# Altium footprint library connectors.PcbLib: 256 footprints (part 16 of 16)
Each footprint in its own frame and in the unit in brackets; x right, y up, seen from the top. Pads: shape width x height; smd on the part's side, far side on the other; paste and mask are expansions set on the pad; w line width, h text height; cw(c..) or ccw(c..) is an arc to the next point about the centre after c.
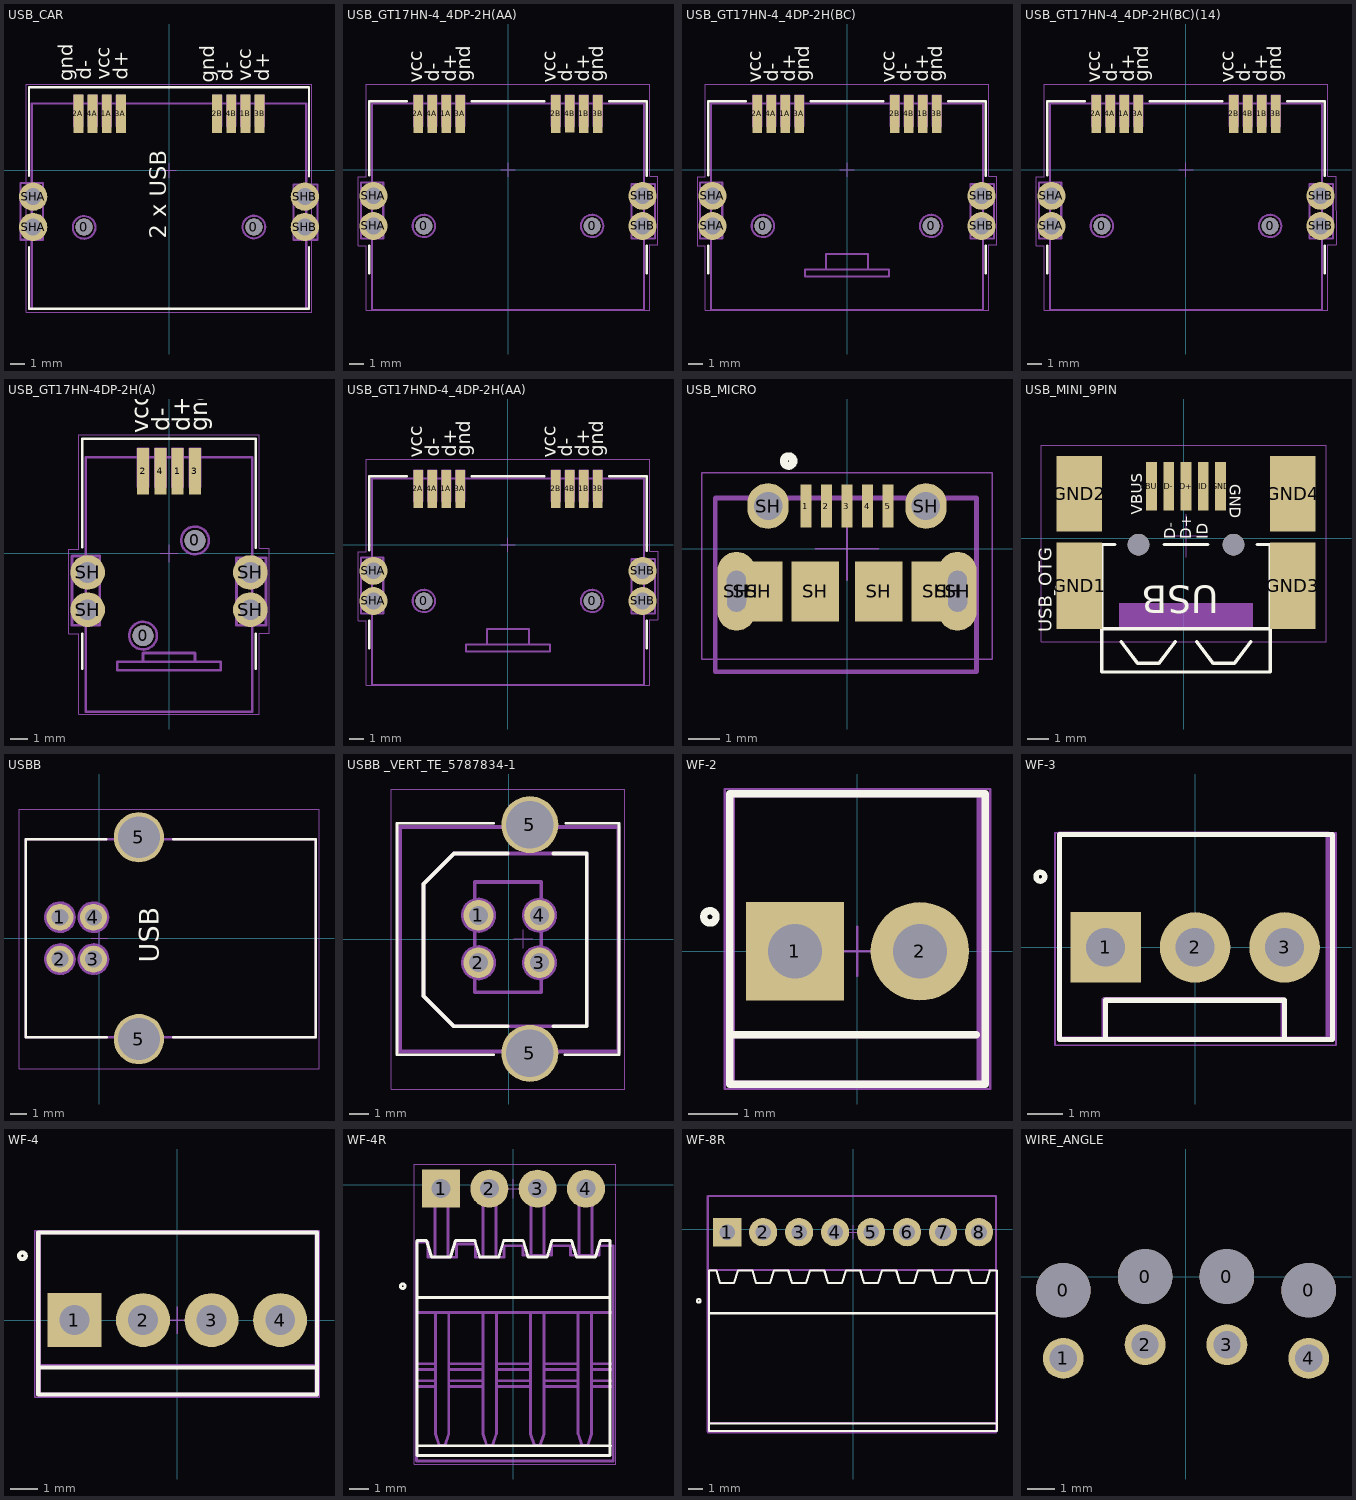
[diagram p15: the footprints below, top view; thin cyan lines are the x and y axes]

## USB_CAR [mm]
height 10.95
pads (14):
  round 1.2 hole 1.2 unplated: 0(-6,-4) 0(6,-4)
  rect 0.7x2.7 smd: 1A(-4.4,4) 1B(5.4,4) 2A(-6.4,4) 2B(3.4,4) 3A(-3.4,4) 3B(6.4,4) 4A(-5.4,4) 4B(4.4,4)
  round 2 hole 1.2: SHA(-9.6,-4) SHA(-9.6,-1.85) SHB(9.6,-1.85) SHB(9.6,-4)
Top Overlay:
  lines w0.15: -9.9,-5.4 -9.9,-9.775 9.9,-9.775 9.9,-5.4 ; -9.9,-0.4 -9.9,5.875 9.9,5.875 9.9,-0.425
  text "2 x USB" at 0.2,-4.825 h2
  text "d+" at -2.9,6.4 h1
  text "vcc" at -4.2,6.4 h1
  text "d-" at -5.5,6.4 h1
  text "gnd" at -6.8,6.3 h1
  text "d-" at 4.5,6.3 h1
  text "vcc" at 5.8,6.3 h1
  text "d+" at 7.1,6.3 h1
  text "gnd" at 3.2,6.2 h1
TopAssy 13:
  circle w0.15: c6,-4 r0.8
  circle w0.15: c-6,-4.025 r0.8
  lines w0.15: -10.5,-4.9 -10.5,-0.9 -8.9,-0.9 -8.9,-4.9 -10.5,-4.9 ; -9.7,-9.8 -9.7,4.725 9.7,4.725 9.7,-9.8 -9.7,-9.8 ; -6.7,3.1 -6.1,3.1 -6.1,5.3 -6.7,5.3 -6.7,3.1 ; -5.7,3.1 -5.1,3.1 -5.1,5.3 -5.7,5.3 -5.7,3.1 ; -4.7,3.1 -4.1,3.1 -4.1,5.3 -4.7,5.3 -4.7,3.1 ; -3.7,3.1 -3.1,3.1 -3.1,5.3 -3.7,5.3 -3.7,3.1 ; 3.1,3.1 3.7,3.1 3.7,5.3 3.1,5.3 3.1,3.1 ; 4.1,3.1 4.7,3.1 4.7,5.3 4.1,5.3 4.1,3.1 ; 5.1,3.1 5.7,3.1 5.7,5.3 5.1,5.3 5.1,3.1 ; 6.1,3.1 6.1,5.3 6.7,5.3 6.7,3.1 6.1,3.1 ; 8.8,-4.9 10.5,-4.9 10.5,-1 8.8,-1 8.8,-4.9
  text "PCB Edge" at -6.3,-9.6 h0.96
TopCourt 15:
  lines w0.05: -0.5,0 0.5,0 ; 0,-0.5 0,0.5 ; -10.1,-10.025 10.1,-10.025 10.1,6.1 -10.1,6.1 -10.1,-10.025
3D body "c-2288060-1-a.step": height 13.57, standoff -2.88, extent -9.8,-9.942 9.8,4.825

## USB_GT17HN-4_4DP-2H(AA) [mm] "USB Connector Hirose GT17HN-4_4DP-2H(AA)"
height 10.95
pads (14):
  round 1.2 hole 1.2 unplated: 0(-6,-4) 0(6,-4)
  rect 0.7x2.7 smd: 1A(-4.4,4) 1B(5.4,4) 2A(-6.4,4) 2B(3.4,4) 3A(-3.4,4) 3B(6.4,4) 4A(-5.4,4) 4B(4.4,4)
  round 2 hole 1.2: SHA(-9.6,-4) SHA(-9.6,-1.85) SHB(9.6,-1.85) SHB(9.6,-4)
Top Overlay:
  lines w0.15: -9.9,-7.4 -9.9,-5.4 ; -9.9,-0.4 -9.9,4.9 -7.2,4.9 ; -2.6,4.9 2.6,4.9 ; 7.2,4.9 9.9,4.9 9.9,-0.425 ; 9.9,-7.4 9.9,-5.4
  text "d-" at -4.9,6.3 h1
  text "vcc" at -6.1,6.2 h1
  text "d+" at -3.7,6.3 h1
  text "gnd" at -2.7,6.3 h1
  text "gnd" at 6.8,6.3 h1
  text "d+" at 5.8,6.3 h1
  text "vcc" at 3.4,6.2 h1
  text "d-" at 4.6,6.3 h1
TopAssy 13:
  circle w0.15: c-6,-4 r0.8
  circle w0.15: c6,-4 r0.8
  lines w0.15: -10.5,-4.9 -8.9,-4.9 -8.9,-0.9 -10.5,-0.9 -10.5,-4.9 ; -9.7,-10 9.7,-10 9.7,4.725 -9.7,4.725 -9.7,-10 ; -6.7,3.1 -6.7,5.3 -6.1,5.3 -6.1,3.1 -6.7,3.1 ; -5.7,3.1 -5.7,5.3 -5.1,5.3 -5.1,3.1 -5.7,3.1 ; -4.7,3.1 -4.7,5.3 -4.1,5.3 -4.1,3.1 -4.7,3.1 ; -3.7,3.1 -3.7,5.3 -3.1,5.3 -3.1,3.1 -3.7,3.1 ; 3.1,3.1 3.1,5.3 3.7,5.3 3.7,3.1 3.1,3.1 ; 4.1,3.1 4.1,5.3 4.7,5.3 4.7,3.1 4.1,3.1 ; 5.1,3.1 5.1,5.3 5.7,5.3 5.7,3.1 5.1,3.1 ; 6.1,3.1 6.7,3.1 6.7,5.3 6.1,5.3 6.1,3.1 ; 8.8,-4.9 8.8,-1 10.5,-1 10.5,-4.9 8.8,-4.9
TopCourt 15:
  lines w0.05: -0.5,0 0.5,0 ; 0,-0.5 0,0.5 ; -10.7,-5.4 -10.1,-5.4 -10.1,-5.994 -10.1,-10.025 10.1,-10.025 10.1,-5.35 10.7,-5.35 10.7,-0.45 10.1,-0.45 10.1,6.1 -10.1,6.1 -10.1,2.069 -10.1,-0.5 -10.7,-0.5 -10.7,-5.4
3D body "GT17HN-44DP-2H(AA).stp": height 13.6, standoff -1, extent -9.8,-9.95 9.8,4.8

## USB_GT17HN-4_4DP-2H(BC) [mm] "USB Connector Hirose GT17HN-4_4DP-2H(BC)"
height 10.95
pads (14):
  round 1.2 hole 1.2 unplated: 0(-6,-4) 0(6,-4)
  rect 0.7x2.7 smd: 1A(-4.4,4) 1B(5.4,4) 2A(-6.4,4) 2B(3.4,4) 3A(-3.4,4) 3B(6.4,4) 4A(-5.4,4) 4B(4.4,4)
  round 2 hole 1.2: SHA(-9.6,-4) SHA(-9.6,-1.85) SHB(9.6,-1.85) SHB(9.6,-4)
Top Overlay:
  lines w0.15: -9.9,-7.4 -9.9,-5.4 ; -9.9,-0.4 -9.9,4.9 -7.2,4.9 ; -2.6,4.9 2.6,4.9 ; 7.2,4.9 9.9,4.9 9.9,-0.425 ; 9.9,-7.4 9.9,-5.4
  text "d-" at 4.6,6.3 h1
  text "vcc" at 3.4,6.2 h1
  text "d+" at 5.8,6.3 h1
  text "gnd" at 6.8,6.3 h1
  text "gnd" at -2.7,6.3 h1
  text "d+" at -3.7,6.3 h1
  text "vcc" at -6.1,6.2 h1
  text "d-" at -4.9,6.3 h1
TopAssy 13:
  circle w0.15: c6,-4 r0.8
  circle w0.15: c-6,-4 r0.8
  lines w0.15: -1.5,-7.1 -1.5,-6 1.5,-6 1.5,-7.1 ; -10.5,-4.9 -10.5,-0.9 -8.9,-0.9 -8.9,-4.9 -10.5,-4.9 ; -9.7,-10 -9.7,4.725 9.7,4.725 9.7,-10 -9.7,-10 ; -6.7,3.1 -6.1,3.1 -6.1,5.3 -6.7,5.3 -6.7,3.1 ; -5.7,3.1 -5.1,3.1 -5.1,5.3 -5.7,5.3 -5.7,3.1 ; -4.7,3.1 -4.1,3.1 -4.1,5.3 -4.7,5.3 -4.7,3.1 ; -3.7,3.1 -3.1,3.1 -3.1,5.3 -3.7,5.3 -3.7,3.1 ; -3,-7.6 3,-7.6 3,-7.1 -3,-7.1 -3,-7.6 ; 3.1,3.1 3.7,3.1 3.7,5.3 3.1,5.3 3.1,3.1 ; 4.1,3.1 4.7,3.1 4.7,5.3 4.1,5.3 4.1,3.1 ; 5.1,3.1 5.7,3.1 5.7,5.3 5.1,5.3 5.1,3.1 ; 6.1,3.1 6.1,5.3 6.7,5.3 6.7,3.1 6.1,3.1 ; 8.8,-4.9 10.5,-4.9 10.5,-1 8.8,-1 8.8,-4.9
  text "PCB Edge" at -1.3,-8 h0.96
TopCourt 15:
  lines w0.05: -0.5,0 0.5,0 ; 0,-0.5 0,0.5 ; -10.7,-5.4 -10.7,-0.5 -10.1,-0.5 -10.1,2.069 -10.1,6.1 10.1,6.1 10.1,-0.45 10.7,-0.45 10.7,-5.35 10.1,-5.35 10.1,-10.025 -10.1,-10.025 -10.1,-5.994 -10.1,-5.4 -10.7,-5.4
3D body "GT17HN-4_4DP-2H(BC).stp": height 19.6, standoff -3, extent -9.8,-9.95 9.8,4.8

## USB_GT17HN-4_4DP-2H(BC)(14) [mm] "USB Connector Hirose USB_GT17HN-4/4DP-2H(BC)(14)"
height 10.95
pads (14):
  round 1.2 hole 1.2 unplated: 0(-6,-4) 0(6,-4)
  rect 0.7x2.7 smd: 1A(-4.4,4) 1B(5.4,4) 2A(-6.4,4) 2B(3.4,4) 3A(-3.4,4) 3B(6.4,4) 4A(-5.4,4) 4B(4.4,4)
  round 2 hole 1.2: SHA(-9.6,-1.85) SHA(-9.6,-4) SHB(9.6,-4) SHB(9.6,-1.85)
Top Overlay:
  lines w0.15: -9.9,-7.4 -9.9,-5.4 ; -9.9,-0.4 -9.9,4.9 -7.2,4.9 ; -2.6,4.9 2.6,4.9 ; 7.2,4.9 9.9,4.9 9.9,-0.425 ; 9.9,-7.4 9.9,-5.4
  text "d-" at 4.6,6.3 h1
  text "vcc" at 3.4,6.2 h1
  text "d+" at 5.8,6.3 h1
  text "gnd" at 6.8,6.3 h1
  text "gnd" at -2.7,6.3 h1
  text "d+" at -3.7,6.3 h1
  text "vcc" at -6.1,6.2 h1
  text "d-" at -4.9,6.3 h1
TopAssy 13:
  circle w0.15: c6,-4 r0.8
  circle w0.15: c-6,-4 r0.8
  lines w0.15: -10.5,-4.9 -10.5,-0.9 -8.9,-0.9 -8.9,-4.9 -10.5,-4.9 ; -9.7,-10 -9.7,4.725 9.7,4.725 9.7,-10 -9.7,-10 ; -6.7,3.1 -6.1,3.1 -6.1,5.3 -6.7,5.3 -6.7,3.1 ; -5.7,3.1 -5.1,3.1 -5.1,5.3 -5.7,5.3 -5.7,3.1 ; -4.7,3.1 -4.1,3.1 -4.1,5.3 -4.7,5.3 -4.7,3.1 ; -3.7,3.1 -3.1,3.1 -3.1,5.3 -3.7,5.3 -3.7,3.1 ; 3.1,3.1 3.7,3.1 3.7,5.3 3.1,5.3 3.1,3.1 ; 4.1,3.1 4.7,3.1 4.7,5.3 4.1,5.3 4.1,3.1 ; 5.1,3.1 5.7,3.1 5.7,5.3 5.1,5.3 5.1,3.1 ; 6.1,3.1 6.1,5.3 6.7,5.3 6.7,3.1 6.1,3.1 ; 8.8,-4.9 10.5,-4.9 10.5,-1 8.8,-1 8.8,-4.9
TopCourt 15:
  lines w0.05: -0.5,0 0.5,0 ; 0,-0.5 0,0.5 ; -10.7,-5.4 -10.7,-0.5 -10.1,-0.5 -10.1,2.069 -10.1,6.1 10.1,6.1 10.1,-0.45 10.7,-0.45 10.7,-5.35 10.1,-5.35 10.1,-10.025 -10.1,-10.025 -10.1,-5.994 -10.1,-5.4 -10.7,-5.4
3D body "GT17HN-4_4DP-2H(BC)(14).stp": height 13.6, standoff -1, extent -9.8,-9.95 9.8,4.8

## USB_GT17HN-4DP-2H(A) [mm] "USB Connector Hirose GT17HN-4DP-2H(A)"
height 10.95
pads (10):
  round 1.2 hole 1.2 unplated: 0(-1.5,-4.75) 0(1.5,0.75)
  rect 0.7x2.7 smd: 1(0.5,4.75) 2(-1.5,4.75) 3(1.5,4.75) 4(-0.5,4.75)
  round 2 hole 1.2: SH(-4.7,-3.25) SH(-4.7,-1.1) SH(4.7,-1.1) SH(4.7,-3.25)
Top Overlay:
  lines w0.15: -5,-6.65 -5,-4.65 ; -5,0.35 -5,6.625 5,6.625 5,0.325 ; 5,-6.65 5,-4.65
  text "gnd" at 2.2,7.05 h1
  text "d+" at 1.2,7.05 h1
  text "vcc" at -1.2,6.95 h1
  text "d-" at 0,7.05 h1
TopAssy 13:
  circle w0.15: c1.5,0.75 r0.8
  circle w0.15: c-1.5,-4.75 r0.8
  lines w0.15: -1.5,-6.25 -1.5,-5.75 1.5,-5.75 1.5,-6.25 ; -5.6,-4.15 -5.6,-0.15 -4,-0.15 -4,-4.15 -5.6,-4.15 ; -4.8,-9.15 -4.8,5.55 4.8,5.55 4.8,-9.15 -4.8,-9.15 ; -3,-6.75 -3,-6.25 3,-6.25 3,-6.75 -3,-6.75 ; -1.8,3.85 -1.2,3.85 -1.2,6.05 -1.8,6.05 -1.8,3.85 ; -0.8,3.85 -0.2,3.85 -0.2,6.05 -0.8,6.05 -0.8,3.85 ; 0.2,3.85 0.8,3.85 0.8,6.05 0.2,6.05 0.2,3.85 ; 1.2,3.85 1.8,3.85 1.8,6.05 1.2,6.05 1.2,3.85 ; 3.9,-4.15 5.6,-4.15 5.6,-0.25 3.9,-0.25 3.9,-4.15
  text "PCB Edge" at -1.3,-7.15 h0.96
TopCourt 15:
  lines w0.05: -0.5,0 0.5,0 ; 0,-0.5 0,0.5 ; -5.8,-4.65 -5.8,0.25 -5.2,0.25 -5.2,6.85 5.2,6.85 5.2,0.3 5.8,0.3 5.8,-4.6 5.2,-4.6 5.2,-9.275 -5.2,-9.275 -5.2,-4.65 -5.8,-4.65
3D body "GT17HN-4DP-2H(A).stp": height 19.6, standoff -3, extent -4.9,-9.2 4.9,5.55

## USB_GT17HND-4_4DP-2H(AA) [mm] "USB Connector Hirose GT17HND-4/4DP-2H(AA)"
height 10.95
pads (14):
  round 1.2 hole 1.2 unplated: 0(-6,-4) 0(6,-4)
  rect 0.7x2.7 smd: 1A(-4.4,4) 1B(5.4,4) 2A(-6.4,4) 2B(3.4,4) 3A(-3.4,4) 3B(6.4,4) 4A(-5.4,4) 4B(4.4,4)
  round 2 hole 1.2: SHA(-9.6,-1.85) SHA(-9.6,-4) SHB(9.6,-4) SHB(9.6,-1.85)
Top Overlay:
  lines w0.15: -9.9,-7.4 -9.9,-5.4 ; -9.9,-0.4 -9.9,4.9 -7.2,4.9 ; -2.6,4.9 2.6,4.9 ; 7.2,4.9 9.9,4.9 9.9,-0.425 ; 9.9,-7.4 9.9,-5.4
  text "d-" at -4.9,6.3 h1
  text "vcc" at -6.1,6.2 h1
  text "d+" at -3.7,6.3 h1
  text "gnd" at -2.7,6.3 h1
  text "gnd" at 6.8,6.3 h1
  text "d+" at 5.8,6.3 h1
  text "vcc" at 3.4,6.2 h1
  text "d-" at 4.6,6.3 h1
TopAssy 13:
  circle w0.15: c-6,-4 r0.8
  circle w0.15: c6,-4 r0.8
  lines w0.15: -1.5,-7.1 -1.5,-6 1.5,-6 1.5,-7.1 ; -10.5,-4.9 -8.9,-4.9 -8.9,-0.9 -10.5,-0.9 -10.5,-4.9 ; -9.7,-10 9.7,-10 9.7,4.725 -9.7,4.725 -9.7,-10 ; -6.7,3.1 -6.7,5.3 -6.1,5.3 -6.1,3.1 -6.7,3.1 ; -5.7,3.1 -5.7,5.3 -5.1,5.3 -5.1,3.1 -5.7,3.1 ; -4.7,3.1 -4.7,5.3 -4.1,5.3 -4.1,3.1 -4.7,3.1 ; -3.7,3.1 -3.7,5.3 -3.1,5.3 -3.1,3.1 -3.7,3.1 ; -3,-7.6 -3,-7.1 3,-7.1 3,-7.6 -3,-7.6 ; 3.1,3.1 3.1,5.3 3.7,5.3 3.7,3.1 3.1,3.1 ; 4.1,3.1 4.1,5.3 4.7,5.3 4.7,3.1 4.1,3.1 ; 5.1,3.1 5.1,5.3 5.7,5.3 5.7,3.1 5.1,3.1 ; 6.1,3.1 6.7,3.1 6.7,5.3 6.1,5.3 6.1,3.1 ; 8.8,-4.9 8.8,-1 10.5,-1 10.5,-4.9 8.8,-4.9
  text "PCB Edge" at -1.3,-8 h0.96
TopCourt 15:
  lines w0.05: -0.5,0 0.5,0 ; 0,-0.5 0,0.5 ; -10.7,-5.4 -10.1,-5.4 -10.1,-5.994 -10.1,-10.025 10.1,-10.025 10.1,-5.35 10.7,-5.35 10.7,-0.45 10.1,-0.45 10.1,6.1 -10.1,6.1 -10.1,2.069 -10.1,-0.5 -10.7,-0.5 -10.7,-5.4
3D body "GT17HND-44DP-2H(AA).stp": height 19.6, standoff -3, extent -9.8,-9.95 9.8,4.8

## USB_MICRO [mm] "MICRO USB B Connector; Molex 105017-0001"
height 0.65
pads (15):
  rect 0.35x1.35 smd mask+0.075: 1(-1.3,1.35) 2(-0.65,1.35) 3(0,1.35) 4(0.65,1.35) 5(1.3,1.35)
  oval 1.2x2.5 hole 0.6 slot 1.3 at 90.4 deg: SH(-3.5,-1.35) SH(3.5,-1.35)
  rrect55% 1.8x1.9 smd: SH(-3.2,-1.35) SH(3.2,-1.35)
  rect 1.5x1.9 smd: SH(-2.8,-1.35) SH(-1,-1.35) SH(1,-1.35) SH(2.8,-1.35)
  oval 1.3x1.45 hole 0.9: SH(-2.5,1.35) SH(2.5,1.35)
Top Overlay:
  circle w0.25: c-1.85,2.775 r0.152
TopAssy 13:
  lines w0.15: -4.175,-3.9 4.1,-3.9 4.1,1.6 -4.175,1.6 -4.175,-3.9
TopCourt 15:
  lines w0.05: -1,0 1,0 ; 0,-1 0,1 ; -4.6,-3.5 4.6,-3.5 4.6,2.4 -4.6,2.4 -4.6,-3.5
3D body "User Library-MicroUSB-B_Molex_105017-0001.step": height 2.66, standoff -0.64, extent -4.1,-3.955 4.1,1.475

## USB_MINI_9PIN [mm]
pads (11):
  rect 0.5x2.25 smd: D+(0.1,2.403) D-(-0.7,2.403) GND(1.7,2.403) ID(0.9,2.403) VBUS(-1.5,2.403)
  rect 2.1x4 smd: GND1(-4.85,-2.203) GND3(5.05,-2.203)
  rect 2.1x3.5 smd: GND2(-4.85,2.047) GND4(5.05,2.047)
  round 1 on Top hole 1 unplated: ""(-2.1,-0.303) ""(2.3,-0.303)
Top Overlay:
  lines w0.15: -3.8,-0.303 -3.8,-6.203 4,-6.203 4,-4.203 ; -3.775,-4.203 4,-4.203 ; -3.775,-0.303 -3.202,-0.303 ; -2.9,-4.803 -2.15,-5.803 -1.15,-5.803 -0.4,-4.803 ; -0.916,-0.303 1.116,-0.303 ; 0.6,-4.803 1.35,-5.803 2.35,-5.803 3.1,-4.803 ; 3.402,-0.303 4,-0.303 4,-4.203
  text "USB_OTG" at -6.115,-4.367 h0.61
  text "VBUS" at -1.932,1.092 h0.51
  text "D-" at -0.408,-0.051 h0.51
  text "D+" at 0.354,-0.051 h0.51
  text "ID" at 1.116,-0.051 h0.51
  text "GND" at 2.132,2.489 h0.51
  text "USB" at 1.624,-2.208 h1.27
Mechanical 6:
  region: 3.2,-4.203 3.2,-3.003 -3,-3.003 -3,-4.203
TopAssy 13:
TopCourt 15:
  lines w0.05: -0.9,0.1 1.1,0.1 ; 0.1,-0.9 0.1,1.1 ; -6.6,-4.8 6.6,-4.8 6.6,4.3 -6.6,4.3 -6.6,-4.8

## USBB [mm]
pads (6):
  round 1.6 hole 1: 1(-2.355,1.25) 2(-2.355,-1.25) 3(-0.355,-1.25) 4(-0.355,1.25)
  round 3 hole 2.5: 5(2.355,-6.02) 5(2.355,6.02)
Top Overlay:
  lines w0.15: 0.4,5.9 -4.4,5.9 -4.4,-5.9 0.445,-5.9 ; 4.4,-5.9 12.9,-5.9 12.9,5.9 4.4,5.9
  text "USB" at 3.925,-1.475 h2
TopAssy 13:
  circle w0.254: c-2.355,1.25 r0.825
  circle w0.254: c-0.355,1.25 r0.825
  circle w0.254: c-0.355,-1.25 r0.825
  circle w0.254: c-2.355,-1.25 r0.825
  lines w0.15: -4.4,-5.9 12.9,-5.9 12.9,5.9 -4.4,5.9 -4.4,-5.9 ; 1.6,-6.5 3.3,-6.5 3.3,-5.6 1.6,-5.6 1.6,-5.9 1.6,-6.5 ; 1.6,5.6 3.3,5.6 3.3,6.5 1.6,6.5 1.6,5.9 1.6,5.6
TopCourt 15:
  lines w0.05: -0.5,0 0.5,0 ; 0,-0.5 0,0.5 ; -4.8,-7.8 -4.8,7.7 13.1,7.7 13.1,-7.8 -4.8,-7.8
3D body "User Library-USB-B.step": height 11, standoff -4.42, extent -4.255,-7.492 12.745,7.392

## USBB _VERT_TE_5787834-1 [mm] "TE_5787834-1"
height 15.62
pads (6):
  round 1.6 hole 1: 1(-1.605,1.25) 2(-1.605,-1.25) 3(1.605,-1.25) 4(1.605,1.25)
  round 3 hole 2.5: 5(1.1,-6.02) 5(1.1,6.02)
Top Overlay:
  lines w0.15: -0.8,-6.1 -5.9,-6.1 -5.9,6.1 -0.8,6.1 ; 2.957,-6.1 5.8,-6.1 5.8,6.1 3,6.1
  lines w0.2: -0.069,4.5 -2.9,4.5 -4.5,2.9 -4.5,-3 -2.9,-4.6 -0.063,-4.6 ; 2.35,-4.6 4.1,-4.6 4.1,4.5 2.35,4.5
TopAssy 13:
  circle w0.2: c-1.605,-1.25 r0.825
  circle w0.2: c1.605,-1.25 r0.825
  circle w0.2: c1.605,1.25 r0.825
  circle w0.2: c-1.605,1.25 r0.825
  lines w0.15: 0.25,-6.5 0.25,-5.9 0.25,-5.6 1.95,-5.6 1.95,-6.5 0.25,-6.5 ; 0.25,5.5 0.25,6.1 0.25,6.4 1.95,6.4 1.95,5.5 0.25,5.5
  lines w0.2: -5.738,-5.923 -5.738,5.9 5.762,5.9 5.762,-5.923 -5.738,-5.923 ; -4.5,-3 -4.5,2.9 -2.9,4.5 4.1,4.5 4.1,-4.6 -2.9,-4.6 -4.5,-3 ; -1.8,-2.8 -0.882,-2.8 1.7,-2.8 1.7,3 -1.8,3 -1.8,-2.8
TopCourt 15:
  lines w0.05: 0.25,0 1.25,0 ; 0.75,-0.5 0.75,0.5 ; -6.2,-7.9 -6.2,7.9 6.1,7.9 6.1,-7.9 -6.2,-7.9
3D body "c-5787834-1-c-3d.stp": height 15.63, standoff -4.01, extent -5.723,-7.575 5.733,7.575

## WF-2 [mm]
pads (2):
  rect 2x2 hole 1.1: 1(-1.27,0)
  round 2 hole 1.1: 2(1.27,0)
Top Overlay:
  circle w0.15: c-3,0.7 r0.125
  lines w0.15: -2.52,-1.7 2.421,-1.7 ; -2.6,-2.7 -2.6,3.2 2.6,3.2 2.6,-2.7 -2.6,-2.7
TopAssy 13:
  lines w0.15: -2.56,-1.7 2.5,-1.7 ; -2.56,-2.7 -2.56,3.2 2.5,3.2 2.5,-2.7 -2.56,-2.7 ; -2.025,-0.675 -0.575,-0.675 -0.575,0.725 -2.025,0.725 -2.025,-0.675
TopCourt 15:
  lines w0.05: -0.5,0 0.5,0 ; 0,-0.5 0,0.5 ; -2.7,-2.8 2.7,-2.8 2.7,3.3 -2.7,3.3 -2.7,-2.8
3D body "User Library-WF-2.step": height 11.83, standoff -2.45, extent -2.63,-2.7 2.57,3.2

## WF-3 [mm] "Разъем питания"
height 11.4
pads (3):
  rect 2x2 hole 1.1: 1(-2.54,0)
  round 2 hole 1.1: 2(0,0) 3(2.54,0)
Top Overlay:
  circle w0.15: c-4.389,2.005 r0.125
  lines w0.15: -2.54,-2.591 -2.54,-1.499 2.54,-1.499 2.54,-2.591 ; -3.85,-2.616 -3.85,3.2 3.9,3.2 3.9,-2.616 -3.85,-2.616
TopAssy 13:
  lines w0.15: -2.58,-2.575 -2.58,-1.482 2.5,-1.482 2.5,-2.575 ; -3.85,-2.6 -3.85,3.217 3.77,3.217 3.77,-2.6 -3.85,-2.6 ; -3.275,-0.725 -3.275,0.675 -1.825,0.675 -1.825,-0.725 -3.275,-0.725
TopCourt 15:
  lines w0.05: -0.5,0 0.5,0 ; 0,-0.5 0,0.5 ; -3.975,-2.775 -3.975,3.25 4,3.25 4,-2.775 -3.975,-2.775
3D body "User Library-WF-3.step": height 11.83, standoff -2.9, extent -3.9,-2.7 3.9,3.2

## WF-4 [mm]
pads (4):
  rect 2x2 hole 1.1: 1(-3.81,0)
  round 2 hole 1.1: 2(-1.27,0) 3(1.27,0) 4(3.81,0)
Top Overlay:
  circle w0.15: c-5.739,2.38 r0.125
  lines w0.15: -5.06,-1.75 5.175,-1.75 ; -5.15,-2.75 -5.15,3.25 5.175,3.25 5.175,-2.75 -5.15,-2.75
TopAssy 13:
  lines w0.15: -5.15,-1.7 5.125,-1.7 ; -5.125,-2.75 -5.125,3.25 5.15,3.25 5.15,-2.75 -5.125,-2.75 ; -4.525,-0.7 -3.075,-0.7 -3.075,0.7 -4.525,0.7 -4.525,-0.7
TopCourt 15:
  lines w0.05: -0.5,0 0.5,0 ; 0,-0.5 0,0.5 ; -5.275,-2.85 5.25,-2.85 5.25,3.3 -5.275,3.3 -5.275,-2.85
3D body "User Library-WF-4.step": height 11.83, standoff -2.45, extent -5.08,-2.7 5.08,3.2

## WF-4R [mm] "Вилка на плату угловая, шаг 2.54мм"
height 2.65
pads (4):
  rect 2x2 hole 1: 1(-3.81,-0.2)
  round 2 hole 1: 2(-1.27,-0.2) 3(1.27,-0.2) 4(3.81,-0.2)
Top Overlay:
  circle w0.15: c-5.825,-5.325 r0.125
  lines w0.15: -5.08,-5.92 5.08,-5.92 ; -5.055,-13.713 5.105,-13.713 ; -5.08,-14.22 5.08,-14.22 5.08,-2.92 4.572,-2.918 4.31,-3.781 3.31,-3.781 3.048,-2.918 2.032,-2.918 1.77,-3.781 0.77,-3.781 0.508,-2.918 -0.508,-2.918 -0.77,-3.781 -1.77,-3.781 -2.032,-2.918 -3.048,-2.918 -3.31,-3.781 -4.31,-3.781 -4.572,-2.918 -5.08,-2.92 -5.08,-14.22
TopAssy 13:
  lines w0.15: -5.1,-10.6 -4.1,-10.6 ; -5.1,-10.3 -4.1,-10.3 ; -5.1,-9.7 -4.1,-9.7 ; -5.1,-9.4 -4.1,-9.4 ; -5.1,-6.7 5.25,-6.7 ; -4.125,-3.75 -4.125,-0.15 -3.45,-0.15 -3.45,-3.75 ; -4.1,-6.7 -4.1,-13.1 -3.9,-13.7 -3.6,-13.7 -3.4,-13.1 -3.4,-6.7 ; -3.4,-10.6 -1.6,-10.6 ; -3.4,-10.3 -1.6,-10.3 ; -3.4,-9.7 -1.6,-9.7 ; -3.4,-9.4 -1.6,-9.4 ; -1.6,-6.7 -1.6,-13.1 -1.4,-13.7 -1.1,-13.7 -0.9,-13.1 -0.9,-6.7 ; -1.6,-3.75 -1.6,-0.125 -0.925,-0.125 -0.925,-3.75 ; -0.9,-10.6 0.9,-10.6 ; -0.9,-10.3 0.9,-10.3 ; -0.9,-9.7 0.9,-9.7 ; -0.9,-9.4 0.9,-9.4 ; 0.9,-6.7 0.9,-13.1 1.1,-13.7 1.4,-13.7 1.6,-13.1 1.6,-6.7 ; 0.925,-3.7 0.925,-0.15 1.6,-0.15 1.6,-3.7 ; 1.6,-10.6 3.4,-10.6 ; 1.6,-10.3 3.4,-10.3 ; 1.6,-9.7 3.4,-9.7 ; 1.6,-9.4 3.4,-9.4 ; 3.4,-6.7 3.4,-13.1 3.6,-13.7 3.9,-13.7 4.1,-13.1 4.1,-6.7 ; 3.45,-3.7 3.45,-0.15 4.125,-0.15 4.125,-3.7 ; 4.1,-10.6 5.25,-10.6 ; 4.1,-10.3 5.25,-10.3 ; 4.1,-9.7 5.25,-9.7 ; 4.1,-9.4 5.25,-9.4 ; -5.1,-14.525 -5.1,-3 -4.5,-3 -4.5,-3.8 -3,-3.8 -3,-3.1 -2,-3.1 -2,-3.8 -0.5,-3.8 -0.5,-3.7 -0.5,-3.2 0.5,-3.2 0.5,-3.7 2,-3.7 2,-3.2 3,-3.2 3,-3.7 4.5,-3.7 4.5,-3.2 5.25,-3.2 5.25,-14.525 -4.975,-14.525 -5.1,-14.525 ; -4.525,-0.925 -3.075,-0.925 -3.075,0.475 -4.525,0.475 -4.525,-0.925
TopCourt 15:
  lines w0.05: -0.5,-0.2 0.5,-0.2 ; 0,-0.7 0,0.3 ; -5.225,-14.675 5.375,-14.675 5.375,1.1 -5.225,1.1 -5.225,-14.675
3D body "User Library-WF-4.step": height 6, standoff 0.1, extent -4.89,-14.529 5.27,-0.25

## WF-8R [mm] "Вилка на плату угловая, шаг 2.54мм"
height 5.8
pads (8):
  rect 2x2 hole 1.1: 1(-8.89,-0.2)
  round 2 hole 1.1: 2(-6.35,-0.2) 3(-3.81,-0.2) 4(-1.27,-0.2) 5(1.27,-0.2) 6(3.81,-0.2) 7(6.35,-0.2) 8(8.89,-0.2)
Top Overlay:
  circle w0.15: c-10.889,-5.045 r0.125
  lines w0.15: -10.16,-5.92 10.16,-5.92 ; -10.135,-13.713 10.16,-13.713 ; 10.16,-2.964 10.16,-14.22 -10.16,-14.22 -10.16,-2.92 -9.652,-2.918 -9.39,-3.781 -8.39,-3.781 -8.128,-2.918 -7.112,-2.918 -6.85,-3.781 -5.85,-3.781 -5.588,-2.918 -4.572,-2.918 -4.31,-3.781 -3.31,-3.781 -3.048,-2.918 -2.032,-2.918 -1.77,-3.781 -0.77,-3.781 -0.508,-2.918 0.508,-2.918 0.77,-3.781 1.77,-3.781 2.032,-2.918 3.048,-2.918 3.31,-3.781 4.31,-3.781 4.572,-2.918 5.588,-2.918 5.85,-3.781 6.85,-3.781 7.112,-2.918 8.128,-2.918 8.39,-3.781 9.39,-3.781 9.652,-2.918 10.16,-2.918
TopAssy 13:
  lines w0.15: -10.275,-2.875 10.075,-2.875 ; -10.25,-13.675 10.1,-13.675 ; -10.25,-14.325 10.1,-14.325 10.1,2.35 -10.25,2.35 -10.25,-14.325 ; -9.6,-0.95 -9.6,0.45 -8.15,0.45 -8.15,-0.95 -9.6,-0.95
TopCourt 15:
  lines w0.05: -0.5,-0.2 0.5,-0.2 ; 0,-0.7 0,0.3 ; -10.3,-14.3 -10.3,2.375 10.125,2.375 10.125,-14.3 -10.3,-14.3

## WIRE_ANGLE [mm] "Connector; WIRE 4 Position"
pads (8):
  round 2 hole 2 unplated: 0(-4.5,-0.5) 0(-1.5,0) 0(1.5,0) 0(4.5,-0.5)
  round 1.5 hole 1: 1(-4.5,-3) 2(-1.5,-2.5) 3(1.5,-2.5) 4(4.5,-3)